# Altium footprint library Connector.PcbLib: 230 footprints (part 15 of 15)
Each footprint in its own frame and in the unit in brackets; x right, y up, seen from the top. Pads: shape width x height; smd on the part's side, far side on the other; paste and mask are expansions set on the pad; w line width, h text height; cw(c..) or ccw(c..) is an arc to the next point about the centre after c.
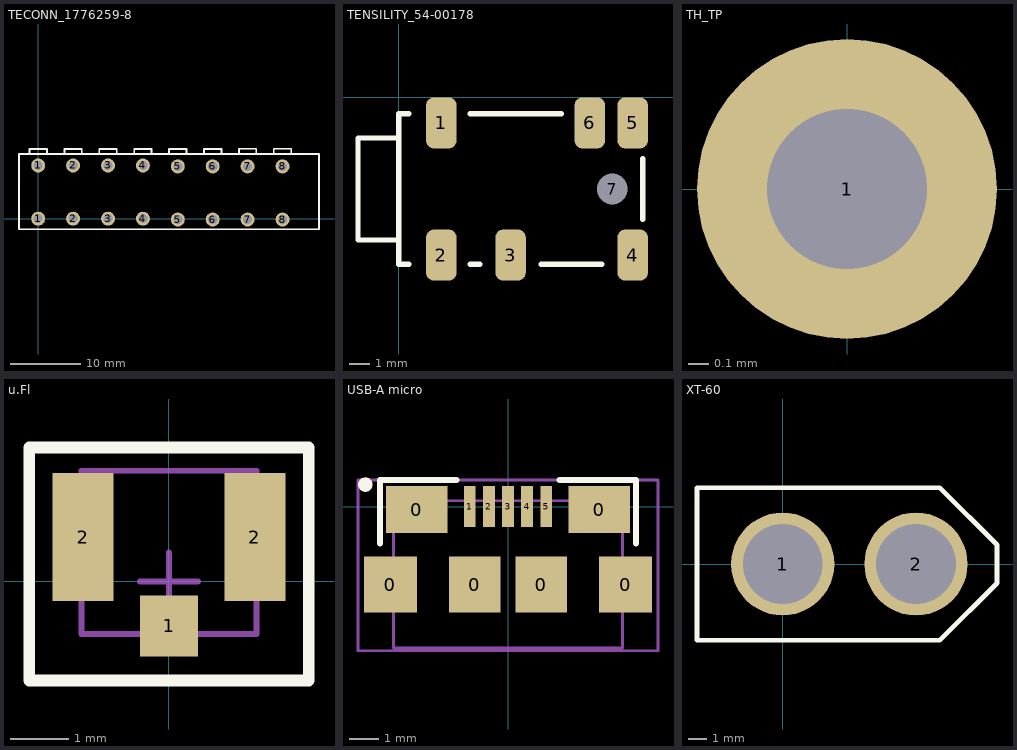
[diagram p14: the footprints below, top view; thin cyan lines are the x and y axes]

## TECONN_1776259-8 [mm] "TERM BLK 8POS TOP ENTRY 5MM PCB"
pads (16):
  round 2 hole 1.3: 1(0,0) 1(0,7.62) 2(5,0) 2(5,7.62) 3(10,0) 3(10,7.62) 4(15,0) 4(15,7.62) 5(20,-0.12) 5(20,7.5) 6(25,-0.12) 6(25,7.5) 7(30,-0.12) 7(30,7.5) 8(35,-0.12) 8(35,7.5)
Top Overlay:
  lines w0.254: -1.25,9.25 -1.25,10 1.25,10 1.25,9.25 ; 3.75,9.25 3.75,10 6.25,10 6.25,9.25 ; 8.75,9.25 8.75,10 11.25,10 11.25,9.25 ; 13.75,9.25 13.75,10 16.25,10 16.25,9.25 ; 18.75,9.25 18.75,10 21.25,10 21.25,9.25 ; 23.75,9.25 23.75,10 26.25,10 26.25,9.25 ; 28.75,9.257 28.75,10.007 31.25,10.007 31.25,9.257 ; 33.75,9.257 33.75,10.007 36.25,10.007 36.25,9.257 ; -2.75,-1.5 -2.75,9.25 40.226,9.25 40.226,-1.5 -2.75,-1.5
3D body: height 14, standoff 7, extent 33.75,8.507 36.25,10.007
3D body: height 14, standoff 7, extent 28.75,8.507 31.25,10.007
3D body: height 14, standoff 0, extent -2.5,-1.25 40,9
3D body: height 14, standoff 7, extent 8.75,8.5 11.25,10
3D body: height 14, standoff 7, extent 13.75,8.5 16.25,10
3D body: height 14, standoff 7, extent 18.75,8.5 21.25,10
3D body: height 14, standoff 7, extent 23.75,8.5 26.25,10
3D body: height 14, standoff 7, extent -1.25,8.5 1.25,10
3D body: height 14, standoff 7, extent 3.75,8.5 6.25,10

## TENSILITY_54-00178 [mm]
pads (7):
  rrect50% 1.5x2.5 smd: 1(2.1,-1.25) 2(2.1,-7.75) 3(5.5,-7.75) 4(11.5,-7.75) 5(11.5,-1.25) 6(9.4,-1.25)
  round 1 hole 1.5 unplated: 7(10.5,-4.5)
Top Overlay:
  lines w0.254: 0,-7 -2,-7 -2,-2 0,-2 ; 0.5,-8.2 0,-8.2 0,-0.8 0.5,-0.8 ; 3.5,-8.2 4,-8.2 ; 3.5,-0.8 8,-0.8 ; 7,-8.2 10,-8.2 ; 12,-6 12,-3
3D body: height 3.7, standoff 0, extent 0,-7.6 12,-1.4
3D body: height 4.35, standoff -0.65, extent -2,-6.997 0,-2.003
3D body: height 0.5, standoff 0, extent 0,-8.2 12,-0.8

## TH_TP [mm]
pads (1):
  round 1.5 hole 0.8: 1(0,0)

## u.Fl [mm] "U.FL (UMCC), IPEX MHF1"
height 1.5
pads (3):
  rect 1x1.05 smd: 1(0,-0.763)
  rect 1.05x2.2 smd: 2(-1.475,0.763) 2(1.475,0.763)
Top Overlay:
  lines w0.2: -2.4,-1.7 2.4,-1.7 2.4,2.3 -2.4,2.3 -2.4,-1.7
TopAssy:
  lines w0.1: -1.5,-0.9 1.5,-0.9 1.5,1.9 -1.5,1.9 -1.5,-0.9
Border:
  lines w0.1: -0.5,0 0.5,0 ; 0,-0.5 0,0.5 ; -2.4,-1.7 2.4,-1.7 2.4,2.3 -2.4,2.3 -2.4,-1.7
3D body "IPX.step": height 1.27, standoff -0.01, extent -1.5,-0.95 1.5,1.9

## USB-A micro [mm] "USB - micro"
height 5
pads (12):
  rect 1.8x1.9 smd: 0(-4,-2.65) 0(4,-2.65)
  rect 2.1x1.6 smd: 0(-3.1,-0.1) 0(3.1,-0.1)
  rect 1.75x1.9 smd: 0(-1.125,-2.65) 0(1.125,-2.65)
  rect 0.4x1.4 smd: 1(-1.3,0) 2(-0.65,0) 3(0,0) 4(0.65,0) 5(1.3,0)
  round 0.5 on Top Overlay: ""(-4.85,0.75)
Top Overlay:
  lines w0.2: -4.35,-1.25 -4.35,0.9 -1.75,0.9 ; 1.75,0.9 4.35,0.9 4.35,-1.25
TopAssy:
  lines w0.1: -3.9,-4.8 -3.9,0.2 3.9,0.2 3.9,-4.8 -3.9,-4.8
Border:
  lines w0.1: -5.1,-4.9 5.1,-4.9 5.1,0.9 -5.1,0.9 -5.1,-4.9
3D body "User Library-micro usb SMD.STEP": height 2.68, standoff -0.02, extent -3.9,-4.8 3.9,0.2

## XT-60 [mm]
pads (2):
  round 5.5 hole 4.25: 1(0,0) 2(7.112,0)
Top Overlay:
  lines w0.254: -4.572,-4.064 8.382,-4.064 11.43,-1.016 11.43,0 11.43,1.016 8.382,4.064 -4.572,4.064 -4.572,-4.064
3D body: height 7, standoff 0, extent -4.572,-4.064 11.43,4.064
3D body: height 15.7, standoff 0, extent -3.81,-3.175 10.795,3.175